# Altium footprint library 我的器件.PCBLIB: 450 footprints (part 1 of 29)
Each footprint in its own frame and in the unit in brackets; x right, y up, seen from the top. Pads: shape width x height; smd on the part's side, far side on the other; paste and mask are expansions set on the pad; w line width, h text height; cw(c..) or ccw(c..) is an arc to the next point about the centre after c.
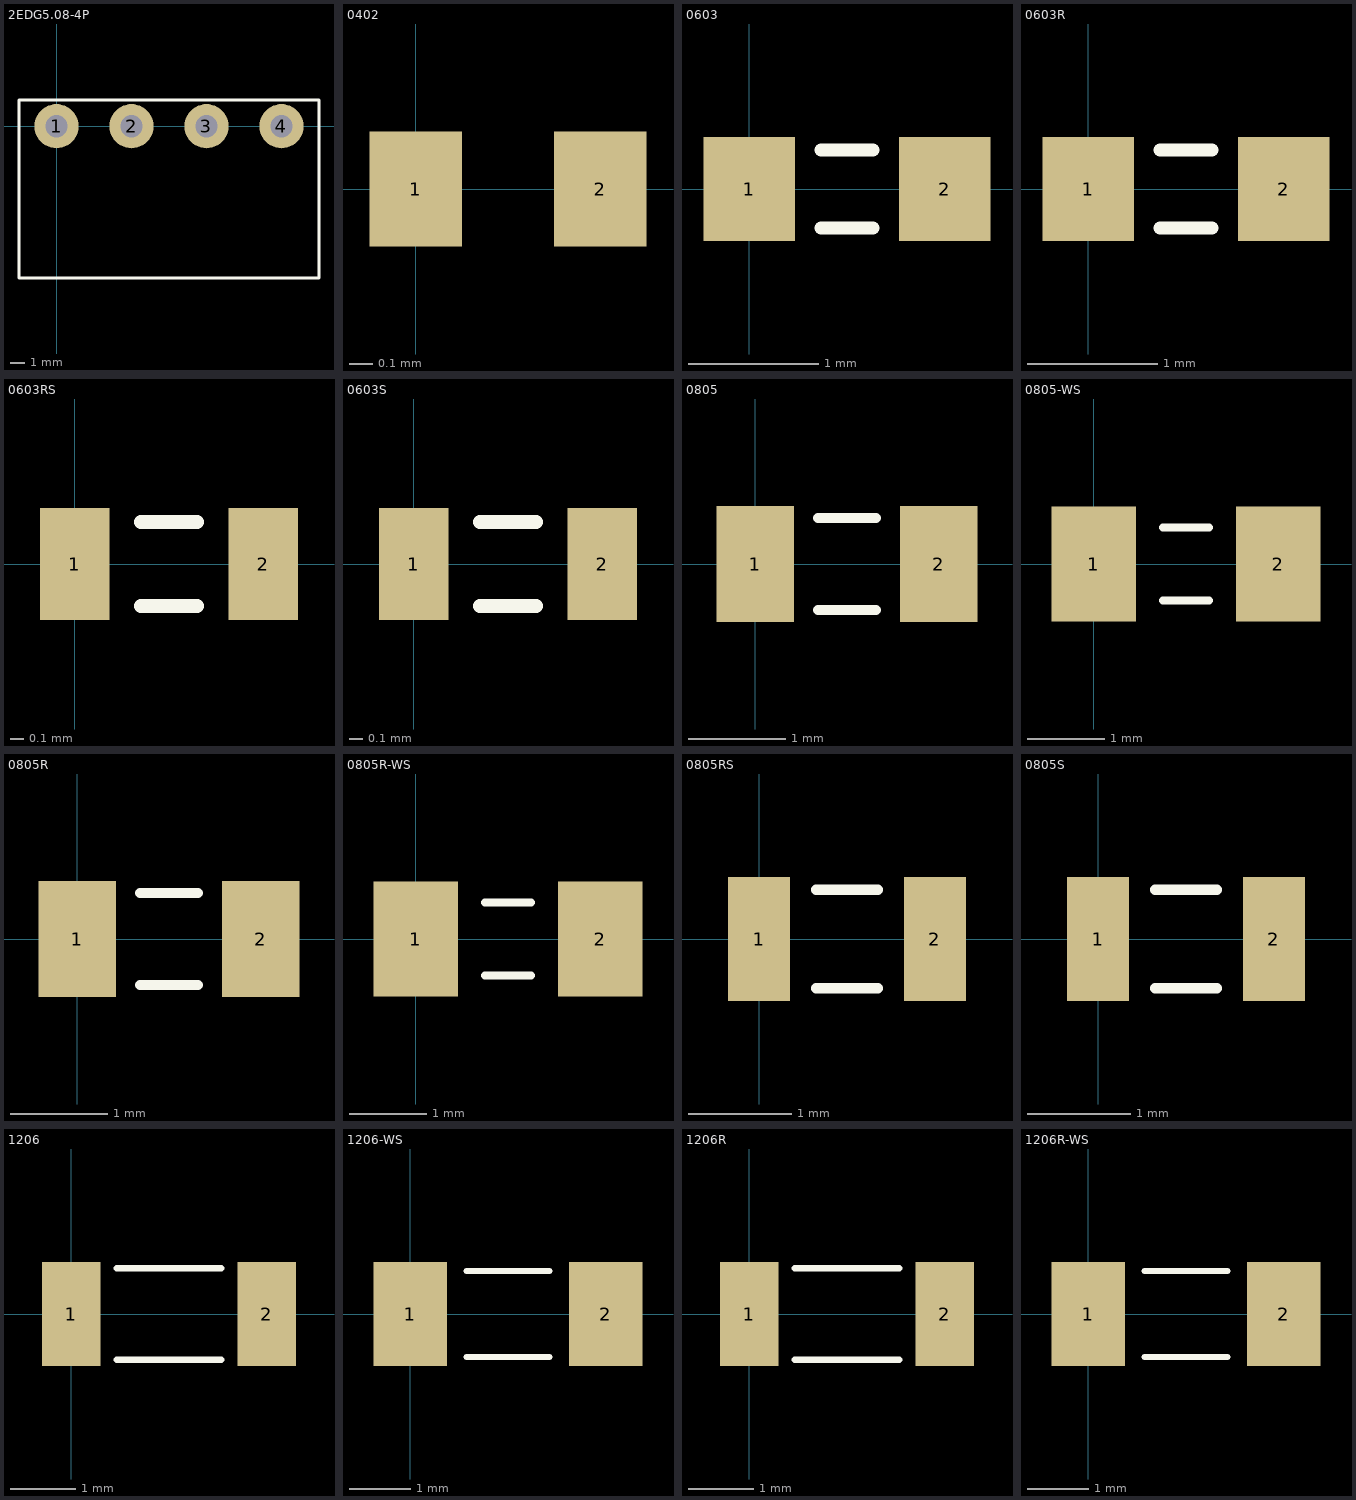
[diagram p0: the footprints below, top view; thin cyan lines are the x and y axes]

## 2EDG5.08-4P [mm]
height 8
pads (4):
  round 3 hole 1.5: 1(0,0) 2(5.08,0) 3(10.16,0) 4(15.24,0)
Top Overlay:
  lines w0.2: -2.54,-10.287 17.78,-10.287 17.78,1.778 -2.54,1.778 -2.54,-10.287

## 0402 [mm]
pads (2):
  rect 0.4x0.5 smd: 1(0,0) 2(0.8,0)
3D body: height 0.45, standoff 0, extent -0.1,-0.25 0.1,0.25
3D body: height 0.45, standoff 0, extent 0.7,-0.25 0.9,0.25
3D body: height 0.45, standoff 0, extent 0.1,-0.25 0.7,0.25

## 0603 [mm] "Body 1.6mmX0.8mm"
height 1
pads (2):
  rect 0.7x0.8 smd: 1(0,0) 2(1.5,0)
Top Overlay:
  lines w0.1: 0.55,-0.3 0.95,-0.3 ; 0.55,0.3 0.95,0.3
3D body: height 1, standoff 0.1, extent -0.05,-0.4 0.15,0.4
3D body: height 1, standoff 0.1, extent 0.15,-0.4 1.35,0.4
3D body: height 1, standoff 0.1, extent 1.35,-0.4 1.55,0.4

## 0603R [mm]
pads (2):
  rect 0.7x0.8 smd: 1(0,0) 2(1.5,0)
Top Overlay:
  lines w0.1: 0.55,-0.3 0.95,-0.3 ; 0.55,0.3 0.95,0.3
3D body: height 0.41, standoff 0.4, extent 0.15,-0.4 1.35,0.4
3D body: height 0.4, standoff 0, extent 1.35,-0.4 1.55,0.4
3D body: height 0.4, standoff 0, extent 0.15,-0.4 1.35,0.4
3D body: height 0.4, standoff 0, extent -0.05,-0.4 0.15,0.4

## 0603RS [mm]
pads (2):
  rect 0.5x0.8 smd: 1(0,0) 2(1.35,0)
Top Overlay:
  lines w0.1: 0.475,-0.3 0.875,-0.3 ; 0.475,0.3 0.875,0.3
3D body: height 0.41, standoff 0.4, extent 0.075,-0.4 1.275,0.4
3D body: height 0.4, standoff 0, extent 1.275,-0.4 1.475,0.4
3D body: height 0.4, standoff 0, extent 0.075,-0.4 1.275,0.4
3D body: height 0.4, standoff 0, extent -0.125,-0.4 0.075,0.4

## 0603S [mm]
pads (2):
  rect 0.5x0.8 smd: 1(0,0) 2(1.35,0)
Top Overlay:
  lines w0.1: 0.475,-0.3 0.875,-0.3 ; 0.475,0.3 0.875,0.3
3D body: height 0.8, standoff 0, extent -0.125,-0.4 0.075,0.4
3D body: height 0.8, standoff 0, extent 0.075,-0.4 1.275,0.4
3D body: height 0.8, standoff 0, extent 1.275,-0.4 1.475,0.4

## 0805 [mm] "Body 2.0 x 1.2 mm"
height 1.1
pads (2):
  rect 0.8x1.2 smd: 1(0,0) 2(1.9,0)
Top Overlay:
  lines w0.1: 0.65,-0.475 1.25,-0.475 ; 0.65,0.475 1.25,0.475
3D body: height 1, standoff 0, extent -0.05,-0.6 0.35,0.6
3D body: height 1, standoff 0, extent 0.35,-0.6 1.55,0.6
3D body: height 1, standoff 0, extent 1.55,-0.6 1.95,0.6

## 0805-WS [mm]
pads (2):
  rect 1.1x1.5 smd: 1(0,0) 2(2.4,0)
Top Overlay:
  lines w0.1: 0.9,-0.475 1.5,-0.475 ; 0.9,0.475 1.5,0.475
3D body: height 1, standoff 0, extent 0.2,-0.6 0.6,0.6
3D body: height 1, standoff 0, extent 0.6,-0.6 1.8,0.6
3D body: height 1, standoff 0, extent 1.8,-0.6 2.2,0.6

## 0805R [mm]
pads (2):
  rect 0.8x1.2 smd: 1(0,0) 2(1.9,0)
Top Overlay:
  lines w0.1: 0.65,-0.475 1.25,-0.475 ; 0.65,0.475 1.25,0.475
3D body: height 0.4, standoff 0, extent 1.55,-0.6 1.95,0.6
3D body: height 0.4, standoff 0, extent -0.05,-0.6 0.35,0.6
3D body: height 0.41, standoff 0.4, extent 0.35,-0.6 1.55,0.6
3D body: height 0.4, standoff 0, extent 0.35,-0.6 1.55,0.6

## 0805R-WS [mm]
pads (2):
  rect 1.1x1.5 smd: 1(0,0) 2(2.4,0)
Top Overlay:
  lines w0.1: 0.9,-0.475 1.5,-0.475 ; 0.9,0.475 1.5,0.475
3D body: height 0.4, standoff 0, extent 1.8,-0.6 2.2,0.6
3D body: height 0.4, standoff 0, extent 0.2,-0.6 0.6,0.6
3D body: height 0.41, standoff 0.4, extent 0.6,-0.6 1.8,0.6
3D body: height 0.4, standoff 0, extent 0.6,-0.6 1.8,0.6

## 0805RS [mm] "Body 2.0 x 1.2 mm"
height 1.1
pads (2):
  rect 0.6x1.2 smd: 1(0,0) 2(1.7,0)
Top Overlay:
  lines w0.1: 0.55,-0.475 1.15,-0.475 ; 0.55,0.475 1.15,0.475
3D body: height 0.4, standoff 0, extent 1.45,-0.6 1.85,0.6
3D body: height 0.4, standoff 0, extent -0.15,-0.6 0.25,0.6
3D body: height 0.41, standoff 0.4, extent 0.25,-0.6 1.45,0.6
3D body: height 0.4, standoff 0, extent 0.25,-0.6 1.45,0.6

## 0805S [mm] "Body 2.0 x 1.2 mm"
height 1.1
pads (2):
  rect 0.6x1.2 smd: 1(0,0) 2(1.7,0)
Top Overlay:
  lines w0.1: 0.55,-0.475 1.15,-0.475 ; 0.55,0.475 1.15,0.475
3D body: height 1, standoff 0, extent 1.45,-0.6 1.85,0.6
3D body: height 1, standoff 0, extent 0.25,-0.6 1.45,0.6
3D body: height 1, standoff 0, extent -0.15,-0.6 0.25,0.6

## 1206 [mm] "Body 3.2mmX1.6mm"
height 1
pads (2):
  rect 0.9x1.6 smd: 1(0,0) 2(3,0)
Top Overlay:
  lines w0.1: 0.7,-0.7 2.3,-0.7 ; 0.7,0.7 2.3,0.7
3D body: height 1, standoff 0, extent 2.7,-0.8 3.1,0.8
3D body: height 1, standoff 0, extent -0.1,-0.8 0.3,0.8
3D body: height 1, standoff 0, extent 0.3,-0.8 2.7,0.8

## 1206-WS [mm]
pads (2):
  rect 1.2x1.7 smd: 1(0,0) 2(3.2,0)
Top Overlay:
  lines w0.1: 0.925,-0.7 2.275,-0.7 ; 0.925,0.7 2.275,0.7
3D body: height 1, standoff 0, extent 0.4,-0.8 2.8,0.8
3D body: height 1, standoff 0, extent 0,-0.8 0.4,0.8
3D body: height 1, standoff 0, extent 2.8,-0.8 3.2,0.8

## 1206R [mm]
pads (2):
  rect 0.9x1.6 smd: 1(0,0) 2(3,0)
Top Overlay:
  lines w0.1: 0.7,-0.7 2.3,-0.7 ; 0.7,0.7 2.3,0.7
3D body: height 0.41, standoff 0.4, extent 0.3,-0.8 2.7,0.8
3D body: height 0.4, standoff 0, extent 2.7,-0.8 3.1,0.8
3D body: height 0.4, standoff 0, extent -0.1,-0.8 0.3,0.8
3D body: height 0.4, standoff 0, extent 0.3,-0.8 2.7,0.8

## 1206R-WS [mm]
pads (2):
  rect 1.2x1.7 smd: 1(0,0) 2(3.2,0)
Top Overlay:
  lines w0.1: 0.925,-0.7 2.275,-0.7 ; 0.925,0.7 2.275,0.7
3D body: height 0.4, standoff 0, extent 0.4,-0.8 2.8,0.8
3D body: height 0.4, standoff 0, extent 0,-0.8 0.4,0.8
3D body: height 0.4, standoff 0, extent 2.8,-0.8 3.2,0.8
3D body: height 0.41, standoff 0.4, extent 0.4,-0.8 2.8,0.8